# Altium footprint library Wurth_Elektronik_Electromechanic_Wire_to_Board_Connectors_rev16a.PCBLIB: 662 footprints (part 41 of 42)
Each footprint in its own frame and in the unit in brackets; x right, y up, seen from the top. Pads: shape width x height; smd on the part's side, far side on the other; paste and mask are expansions set on the pad; w line width, h text height; cw(c..) or ccw(c..) is an arc to the next point about the centre after c.
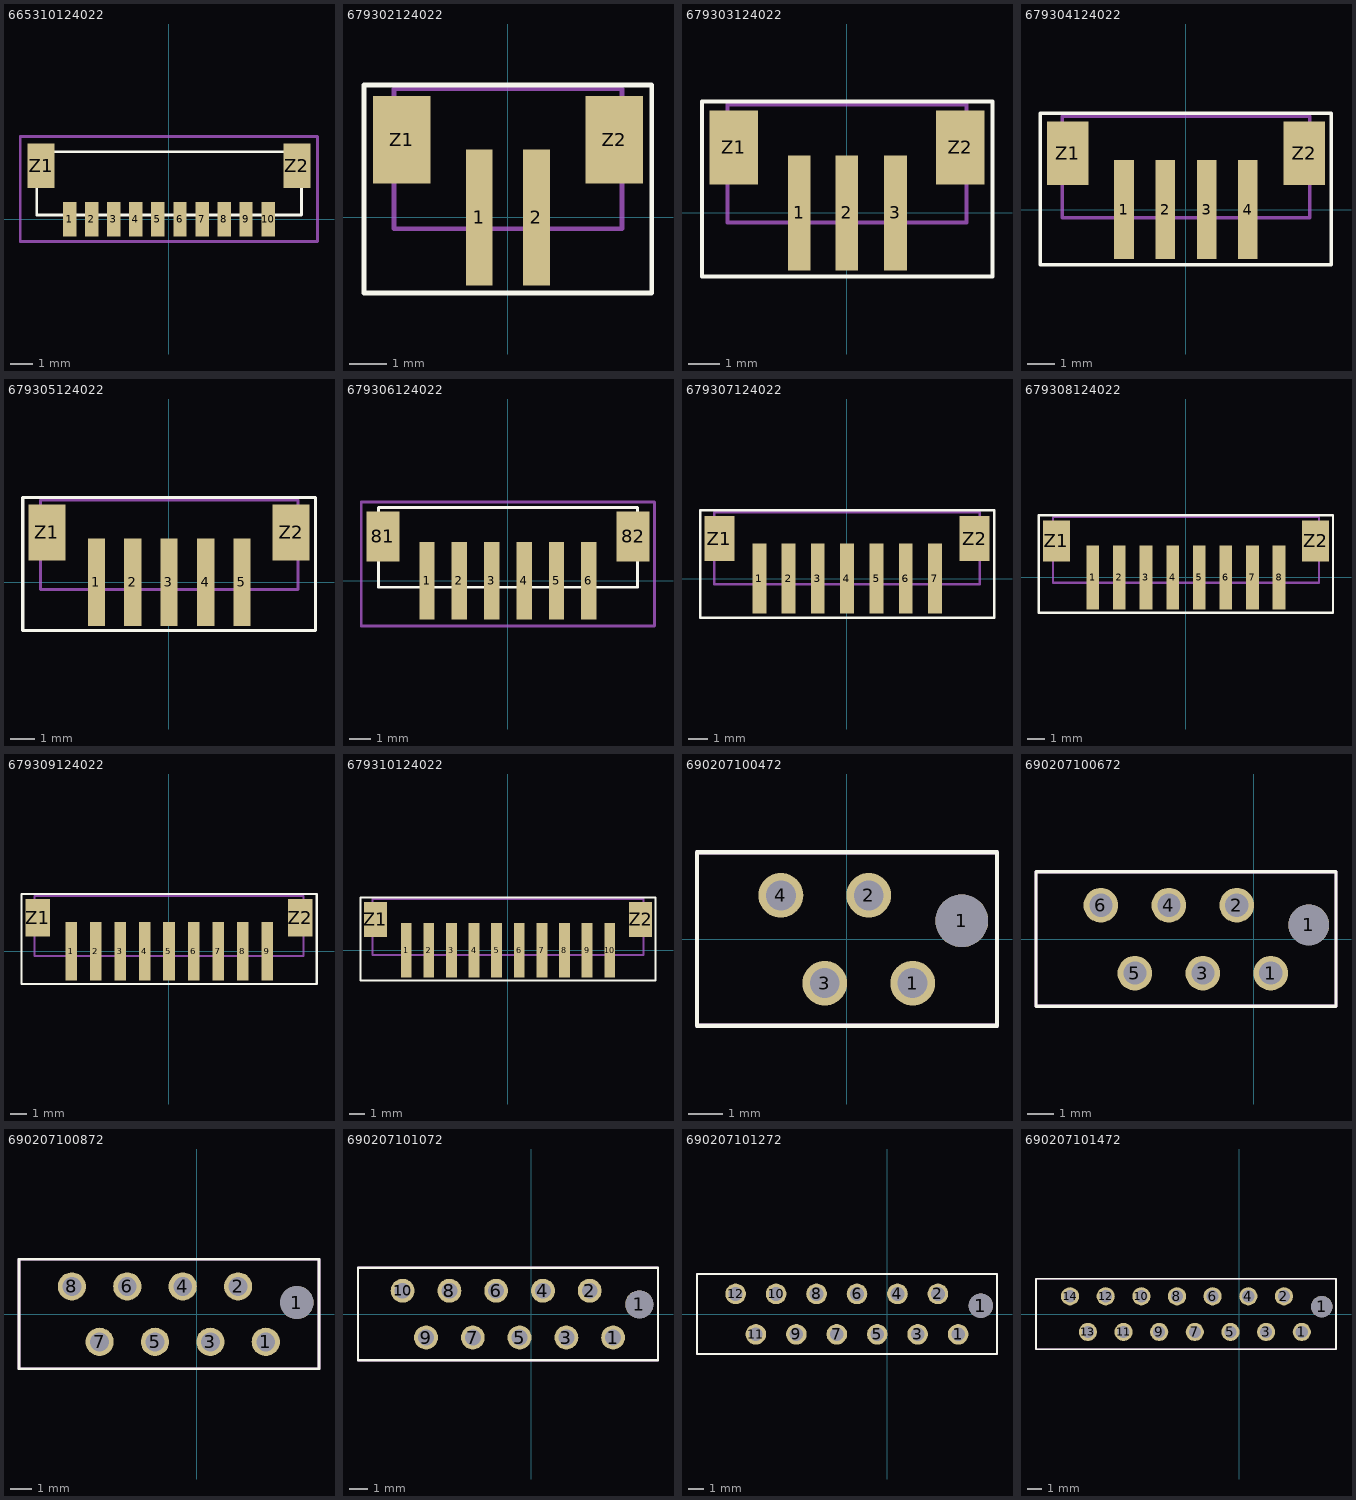
[diagram p40: the footprints below, top view; thin cyan lines are the x and y axes]

## 665310124022 [mil]
pads (12):
  rect 24x62 smd: 1(-177.17,0) 2(-137.8,0) 3(-98.43,0) 4(-59.06,0) 5(-19.68,0) 6(20,0) 7(60,0) 8(99,0) 9(138,0) 10(178,0)
  rect 48x79 smd: Z1(-228.35,96) Z2(229,96)
Top Overlay:
  lines w5: -236.22,8 -236.22,121 237,121 237,8 -236.22,8
Mechanical 2:
  text ">NAME" at -236.22,178 h77.5
Mechanical 4:
  text ">VALUE" at -236.22,-98.43 h77.5
Mechanical 27:
  lines w5: -265.75,-39.37 -265.75,148 266,148 266,-39.37 -265.75,-39.37

## 679302124022 [mil]
pads (4):
  rect 28x142 smd: 1(-29.53,0) 2(30,0)
  rect 60x91 smd: Z1(-110.24,81) Z2(111,81)
Top Overlay:
  lines w5: -149.61,-78.74 150,-78.74 150,138 -149.61,138 -149.61,-78.74
Mechanical 2:
  text ">NAME" at -106.89,162 h77.5
Mechanical 4:
  text ">VALUE" at -111.32,-156 h77.5
Mechanical 16:
  lines w5: -118.11,-11.81 -118.11,134 119,134 119,-11.81 -118.11,-11.81
  text "1" at -50,0 h77.5

## 679303124022 [mil]
pads (5):
  rect 28x142 smd: 1(-59.06,0) 2(0,0) 3(60,0)
  rect 60x91 smd: Z1(-139.76,81) Z2(140,81)
Top Overlay:
  lines w5: -179.13,-78.74 180,-78.74 180,138 -179.13,138 -179.13,-78.74
Mechanical 2:
  text ">NAME" at -111.42,162 h77.5
Mechanical 4:
  text ">VALUE" at -140.85,-156 h77.5
Mechanical 16:
  lines w5: -147.64,-11.81 -147.64,134 148,134 148,-11.81 -147.64,-11.81
  text "1" at -79.53,0 h77.5

## 679304124022 [mil]
pads (6):
  rect 28x142 smd: 1(-88.58,0) 2(-29.53,0) 3(30,0) 4(89,0)
  rect 60x91 smd: Z1(-169.29,81) Z2(170,81)
Top Overlay:
  lines w5: -208.66,-78.74 209,-78.74 209,138 -208.66,138 -208.66,-78.74
Mechanical 2:
  text ">NAME" at -115.94,162 h77.5
Mechanical 4:
  text ">VALUE" at -145.37,-156 h77.5
Mechanical 16:
  lines w5: -177.17,-11.81 -177.17,134 178,134 178,-11.81 -177.17,-11.81
  text "1" at -109.06,0 h77.5

## 679305124022 [mil]
pads (7):
  rect 28x142 smd: 1(-118.11,0) 2(-59.06,0) 3(0,0) 4(60,0) 5(119,0)
  rect 60x91 smd: Z1(-198.82,81) Z2(199,81)
Top Overlay:
  lines w5: -238.19,-78.74 239,-78.74 239,138 -238.19,138 -238.19,-78.74
Mechanical 2:
  text ">NAME" at -145.47,162 h77.5
Mechanical 4:
  text ">VALUE" at -149.9,-156 h77.5
Mechanical 16:
  lines w5: -209.15,-11.81 -209.15,134 210,134 210,-11.81 -209.15,-11.81
  text "1" at -138.58,0 h77.5

## 679306124022 [mil]
pads (8):
  rect 28x142 smd: 1(-147.64,0) 2(-88.58,0) 3(-29.53,0) 4(30,0) 5(89,0) 6(148,0)
  rect 60x91 smd: 81(-228.35,81) 82(229,81)
Top Overlay:
  lines w5: -236.22,-11.81 -236.22,134 237,134 237,-11.81 -236.22,-11.81
Mechanical 2:
  text ">NAME" at -236.22,154 h77.5
Mechanical 4:
  text ">VALUE" at -236.22,-136.93 h77.5
Mechanical 16:
  text "1" at -161.93,3 h77.5
Mechanical 27:
  lines w5: -267.72,-82.68 -267.72,144 268,144 268,-82.68 -267.72,-82.68

## 679307124022 [mil]
pads (9):
  rect 28x142 smd: 1(-177.17,0) 2(-118.11,0) 3(-59.06,0) 4(0,0) 5(60,0) 6(119,0) 7(178,0)
  rect 60x91 smd: Z1(-257.87,81) Z2(258,81)
Top Overlay:
  lines w5: -297.24,-78.74 298,-78.74 298,138 -297.24,138 -297.24,-78.74
Mechanical 2:
  text ">NAME" at -129.53,162 h77.5
Mechanical 4:
  text ">VALUE" at -133.96,-156 h77.5
Mechanical 16:
  lines w5: -268.21,-11.81 -268.21,134 269,134 269,-11.81 -268.21,-11.81
  text "1" at -197.64,0 h77.5

## 679308124022 [mil]
pads (10):
  rect 28x142 smd: 1(-206.69,0) 2(-147.64,0) 3(-88.58,0) 4(-29.53,0) 5(30,0) 6(89,0) 7(148,0) 8(207,0)
  rect 60x91 smd: Z1(-287.4,81) Z2(288,81)
Top Overlay:
  lines w5: -326.77,-78.74 327,-78.74 327,138 -326.77,138 -326.77,-78.74
Mechanical 2:
  text ">NAME" at -109.06,162 h77.5
Mechanical 4:
  text ">VALUE" at -113.48,-156 h77.5
Mechanical 16:
  lines w5: -295.28,-11.81 -295.28,134 296,134 296,-11.81 -295.28,-11.81
  text "1" at -227.17,0 h77.5

## 679309124022 [mil]
pads (11):
  rect 28x142 smd: 1(-236.22,0) 2(-177.17,0) 3(-118.11,0) 4(-59.06,0) 5(0,0) 6(60,0) 7(119,0) 8(178,0) 9(237,0)
  rect 60x91 smd: Z1(-316.93,81) Z2(317,81)
Top Overlay:
  lines w5: -356.3,-78.74 357,-78.74 357,138 -356.3,138 -356.3,-78.74
Mechanical 2:
  text ">NAME" at -113.58,162 h77.5
Mechanical 4:
  text ">VALUE" at -118.01,-156 h77.5
Mechanical 16:
  lines w5: -324.8,-11.81 -324.8,134 325,134 325,-11.81 -324.8,-11.81
  text "1" at -256.69,0 h77.5

## 679310124022 [mil]
pads (12):
  rect 28x142 smd: 1(-265.75,0) 2(-206.69,0) 3(-147.64,0) 4(-88.58,0) 5(-29.53,0) 6(30,0) 7(89,0) 8(148,0) 9(207,0) 10(266,0)
  rect 60x91 smd: Z1(-346.46,81) Z2(347,81)
Top Overlay:
  lines w5: -385.83,-78.74 386,-78.74 386,138 -385.83,138 -385.83,-78.74
Mechanical 2:
  text ">NAME" at -118.11,162 h77.5
Mechanical 4:
  text ">VALUE" at -147.54,-156 h77.5
Mechanical 16:
  lines w5: -354.33,-11.81 -354.33,134 355,134 355,-11.81 -354.33,-11.81
  text "1" at -286.22,0 h77.5

## 690207100472 [mil]
pads (5):
  round 51 hole 34: 1(75,-50) 2(25,50) 3(-25,-50) 4(-75,50)
  round 60 hole 60: 1(131,21)
Top Overlay:
  lines w5: -170.47,-98.43 171,-98.43 171,99 -170.47,99 -170.47,-98.43
Mechanical 2:
  text ">NAME" at -489.66,18 h77.5
Mechanical 4:
  text ">VALUE" at -489.66,-81.27 h77.5
Mechanical 16:
  lines w5: -170.47,-98.43 -170.47,99 171,99 171,-98.43 -170.47,-98.43
  text "1" at 73,-72.05 h77.5
  text "4" at -98.43,0 h77.5

## 690207100672 [mil]
pads (7):
  round 51 hole 34: 1(25,-50) 2(-25,50) 3(-75,-50) 4(-125,50) 5(-175,-50) 6(-225,50)
  round 60 hole 60: 1(81,21)
Top Overlay:
  lines w5: -320.47,-98.43 121,-98.43 121,99 -320.47,99 -320.47,-98.43
Mechanical 2:
  text ">NAME" at -214.66,118 h77.5
Mechanical 4:
  text ">VALUE" at -239.66,-181.27 h77.5
Mechanical 16:
  lines w5: -320.47,-98.43 -320.47,99 121,99 121,-98.43 -320.47,-98.43
  text "1" at 23,-72.05 h77.5
  text "6" at -248.43,25 h77.5

## 690207100872 [mil]
pads (9):
  round 51 hole 34: 1(125,-50) 2(75,50) 3(25,-50) 4(-25,50) 5(-75,-50) 6(-125,50) 7(-175,-50) 8(-225,50)
  round 60 hole 60: 1(181,21)
Top Overlay:
  lines w5: -320.47,-98.43 221,-98.43 221,99 -320.47,99 -320.47,-98.43
Mechanical 2:
  text ">NAME" at -114.66,118 h77.5
Mechanical 4:
  text ">VALUE" at -139.66,-181.27 h77.5
Mechanical 16:
  lines w5: -320.47,-98.43 -320.47,99 221,99 221,-98.43 -320.47,-98.43
  text "1" at 173,-72.05 h77.5
  text "8" at -298.43,25 h77.5

## 690207101072 [mil]
pads (11):
  round 51 hole 34: 1(175,-50) 2(125,50) 3(75,-50) 4(25,50) 5(-25,-50) 6(-75,50) 7(-125,-50) 8(-175,50) 9(-225,-50) 10(-275,50)
  round 60 hole 60: 1(231,21)
Top Overlay:
  lines w5: -370.47,-98.43 271,-98.43 271,99 -370.47,99 -370.47,-98.43
Mechanical 2:
  text ">NAME" at -114.66,118 h77.5
Mechanical 4:
  text ">VALUE" at -139.66,-181.27 h77.5
Mechanical 16:
  lines w5: -370.47,-98.43 -370.47,99 271,99 271,-98.43 -370.47,-98.43
  text "1" at 223,-72.05 h77.5
  text "10" at -373.43,25 h77.5

## 690207101272 [mil]
pads (13):
  round 51 hole 34: 1(175,-50) 2(125,50) 3(75,-50) 4(25,50) 5(-25,-50) 6(-75,50) 7(-125,-50) 8(-175,50) 9(-225,-50) 10(-275,50) 11(-325,-50) 12(-375,50)
  round 60 hole 60: 1(231,21)
Top Overlay:
  lines w5: -470.47,-98.43 271,-98.43 271,99 -470.47,99 -470.47,-98.43
Mechanical 2:
  text ">NAME" at -114.66,118 h77.5
Mechanical 4:
  text ">VALUE" at -139.66,-181.27 h77.5
Mechanical 16:
  lines w5: -470.47,-98.43 -470.47,99 271,99 271,-98.43 -470.47,-98.43
  text "1" at 223,-72.05 h77.5
  text "12" at -448.43,25 h77.5

## 690207101472 [mil]
pads (15):
  round 51 hole 34: 1(175,-50) 2(125,50) 3(75,-50) 4(25,50) 5(-25,-50) 6(-75,50) 7(-125,-50) 8(-175,50) 9(-225,-50) 10(-275,50) 11(-325,-50) 12(-375,50) 13(-425,-50) 14(-475,50)
  round 60 hole 60: 1(231,21)
Top Overlay:
  lines w5: -570.47,-98.43 271,-98.43 271,99 -570.47,99 -570.47,-98.43
Mechanical 2:
  text ">NAME" at -264.66,118 h77.5
Mechanical 4:
  text ">VALUE" at -289.66,-181.27 h77.5
Mechanical 16:
  lines w5: -570.47,-98.43 -570.47,99 271,99 271,-98.43 -570.47,-98.43
  text "1" at 173,-72.05 h77.5
  text "14" at -525,25 h77.5